# Altium footprint library Rocket_library.PcbLib: 65 footprints (part 5 of 5)
Each footprint in its own frame and in the unit in brackets; x right, y up, seen from the top. Pads: shape width x height; smd on the part's side, far side on the other; paste and mask are expansions set on the pad; w line width, h text height; cw(c..) or ccw(c..) is an arc to the next point about the centre after c.
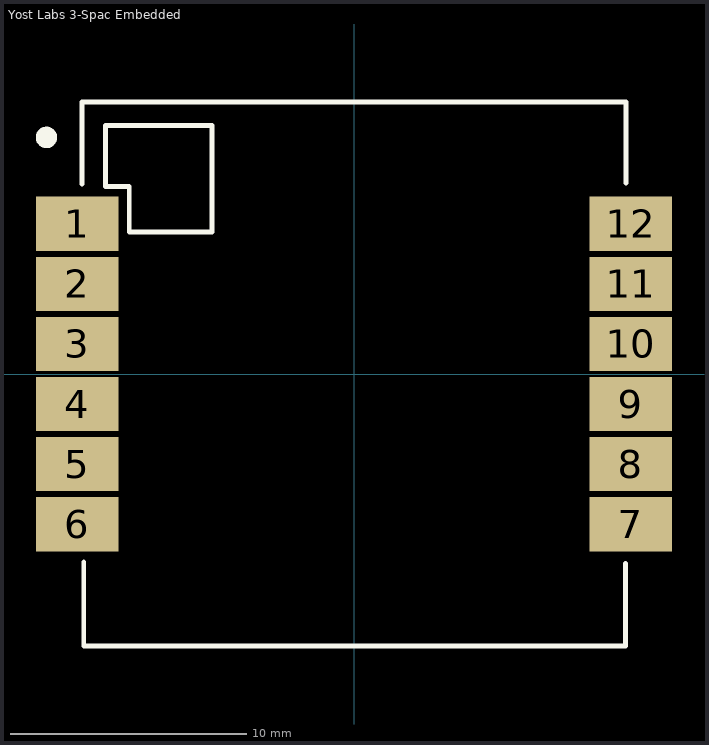
[diagram p4: the footprint, top view; thin cyan lines are the x and y axes]

## Yost Labs 3-Spac Embedded [mm]
pads (12):
  rect 3.5x2.29 smd: 1(-11.7,6.35) 2(-11.7,3.81) 3(-11.7,1.27) 4(-11.7,-1.27) 5(-11.7,-3.81) 6(-11.7,-6.35) 7(11.7,-6.35) 8(11.7,-3.81) 9(11.7,-1.27) 10(11.7,1.27) 11(11.7,3.81) 12(11.7,6.35)
Top Overlay:
  circle w0.5: c-13,10 r0.203
  lines w0.2: -11.5,8.025 -11.5,11.5 11.5,11.5 11.5,8.075 ; -11.425,-7.95 -11.425,-11.5 11.475,-11.5 11.475,-8 ; -10.5,7.925 -10.5,10.5 -6,10.5 -6,6 -9.5,6 -9.5,7.925 -10.5,7.925
3D body: height 2.2, standoff 0, extent -11.499,-11.499 11.499,11.499